# Altium footprint library Molex FFC - FPC Connectors (SMT).PcbLib: 638 footprints (part 27 of 40)
Each footprint in its own frame and in the unit in brackets; x right, y up, seen from the top. Pads: shape width x height; smd on the part's side, far side on the other; paste and mask are expansions set on the pad; w line width, h text height; cw(c..) or ccw(c..) is an arc to the next point about the centre after c.
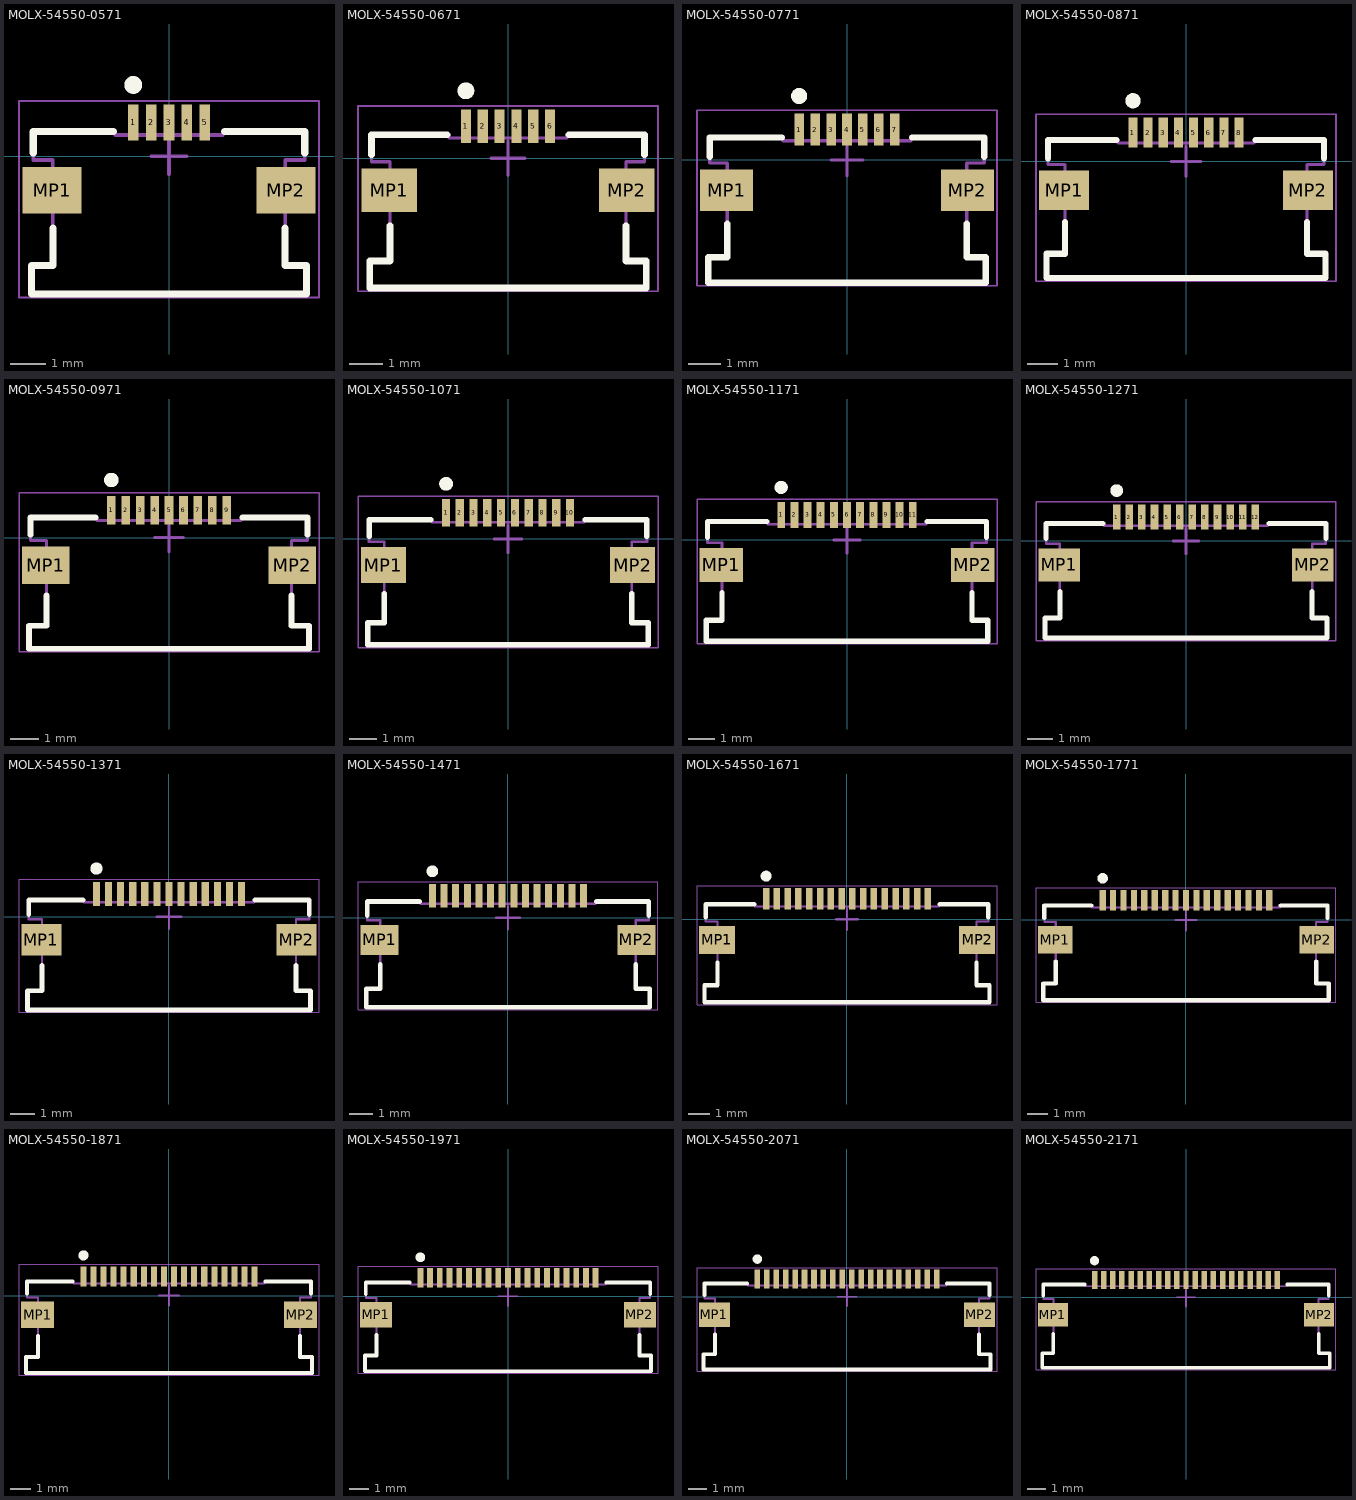
[diagram p26: the footprints below, top view; thin cyan lines are the x and y axes]

## MOLX-54550-0571 [mm] "FPC Connector, 5-Leads, Right Angle, Pitch 0.5 mm, Mated Height 1.2 mm, SMT"
height 1.212
pads (7):
  rect 0.3x1 smd: 1(-1,0.95) 2(-0.5,0.95) 3(0,0.95) 4(0.5,0.95) 5(1,0.95)
  rect 1.65x1.3 smd: MP1(-3.275,-0.95) MP2(3.275,-0.95)
Top Overlay:
  circle w0.25: c-1,2 r0.125
  lines w0.2: -3.85,-3.85 -3.85,-3.05 -3.25,-3.05 -3.25,-2 ; -3.85,-3.85 3.85,-3.85 ; -3.8,0.1 -3.8,0.7 -1.55,0.7 ; 1.55,0.7 3.8,0.7 3.8,0.1 ; 3.25,-2 3.25,-3.05 3.85,-3.05 3.85,-3.85
Mechanical 13:
  lines w0.1: -3.85,-3.85 -3.85,-3.05 -3.25,-3.05 -3.25,-0.1 -3.8,-0.1 -3.8,0.7 -1.5,0.7 -1.5,0.6 1.5,0.6 1.5,0.7 3.8,0.7 3.8,-0.1 3.25,-0.1 3.25,-3.05 3.85,-3.05 3.85,-3.85 -3.85,-3.85
Mechanical 15:
  lines w0.05: -4.2,-3.95 -4.2,1.55 4.2,1.55 4.2,-3.95 -4.2,-3.95
  lines w0.1: -0.5,0 0.5,0 ; 0,-0.5 0,0.5
3D body: height 0.25, standoff 0, extent -3.85,-3.85 3.85,1.15

## MOLX-54550-0671 [mm] "FPC Connector, 6-Leads, Right Angle, Pitch 0.5 mm, Mated Height 1.2 mm, SMT"
height 1.212
pads (8):
  rect 0.3x1 smd: 1(-1.25,0.95) 2(-0.75,0.95) 3(-0.25,0.95) 4(0.25,0.95) 5(0.75,0.95) 6(1.25,0.95)
  rect 1.65x1.3 smd: MP1(-3.525,-0.95) MP2(3.525,-0.95)
Top Overlay:
  circle w0.25: c-1.25,2 r0.125
  lines w0.2: -4.1,-3.85 -4.1,-3.05 -3.5,-3.05 -3.5,-2 ; -4.1,-3.85 4.1,-3.85 ; -4.05,0.1 -4.05,0.7 -1.8,0.7 ; 1.8,0.7 4.05,0.7 4.05,0.1 ; 3.5,-2 3.5,-3.05 4.1,-3.05 4.1,-3.85
Mechanical 13:
  lines w0.1: -4.1,-3.85 -4.1,-3.05 -3.5,-3.05 -3.5,-0.1 -4.05,-0.1 -4.05,0.7 -1.75,0.7 -1.75,0.6 1.75,0.6 1.75,0.7 4.05,0.7 4.05,-0.1 3.5,-0.1 3.5,-3.05 4.1,-3.05 4.1,-3.85 -4.1,-3.85
Mechanical 15:
  lines w0.05: -4.45,-3.95 -4.45,1.55 4.45,1.55 4.45,-3.95 -4.45,-3.95
  lines w0.1: -0.5,0 0.5,0 ; 0,-0.5 0,0.5
3D body: height 0.25, standoff 0, extent -4.1,-3.85 4.1,1.15

## MOLX-54550-0771 [mm] "FPC Connector, 7-Leads, Right Angle, Pitch 0.5 mm, Mated Height 1.2 mm, SMT"
height 1.212
pads (9):
  rect 0.3x1 smd: 1(-1.5,0.95) 2(-1,0.95) 3(-0.5,0.95) 4(0,0.95) 5(0.5,0.95) 6(1,0.95) 7(1.5,0.95)
  rect 1.65x1.3 smd: MP1(-3.775,-0.95) MP2(3.775,-0.95)
Top Overlay:
  circle w0.25: c-1.5,2 r0.125
  lines w0.2: -4.35,-3.85 -4.35,-3.05 -3.75,-3.05 -3.75,-2 ; -4.35,-3.85 4.35,-3.85 ; -4.3,0.1 -4.3,0.7 -2.05,0.7 ; 2.05,0.7 4.3,0.7 4.3,0.1 ; 3.75,-2 3.75,-3.05 4.35,-3.05 4.35,-3.85
Mechanical 13:
  lines w0.1: -4.35,-3.85 -4.35,-3.05 -3.75,-3.05 -3.75,-0.1 -4.3,-0.1 -4.3,0.7 -2,0.7 -2,0.6 2,0.6 2,0.7 4.3,0.7 4.3,-0.1 3.75,-0.1 3.75,-3.05 4.35,-3.05 4.35,-3.85 -4.35,-3.85
Mechanical 15:
  lines w0.05: -4.7,-3.95 4.7,-3.95 4.7,1.55 -4.7,1.55 -4.7,-3.95
  lines w0.1: -0.5,0 0.5,0 ; 0,-0.5 0,0.5
3D body: height 0.25, standoff 0, extent -4.35,-3.85 4.35,1.15

## MOLX-54550-0871 [mm] "FPC Connector, 8-Leads, Right Angle, Pitch 0.5 mm, Mated Height 1.2 mm, SMT"
height 1.212
pads (10):
  rect 0.3x1 smd: 1(-1.75,0.95) 2(-1.25,0.95) 3(-0.75,0.95) 4(-0.25,0.95) 5(0.25,0.95) 6(0.75,0.95) 7(1.25,0.95) 8(1.75,0.95)
  rect 1.65x1.3 smd: MP1(-4.025,-0.95) MP2(4.025,-0.95)
Top Overlay:
  circle w0.25: c-1.75,2 r0.125
  lines w0.2: -4.6,-3.85 -4.6,-3.05 -4,-3.05 -4,-2 ; -4.6,-3.85 4.6,-3.85 ; -4.55,0.1 -4.55,0.7 -2.3,0.7 ; 2.3,0.7 4.55,0.7 4.55,0.1 ; 4,-2 4,-3.05 4.6,-3.05 4.6,-3.85
Mechanical 13:
  lines w0.1: -4.6,-3.85 -4.6,-3.05 -4,-3.05 -4,-0.1 -4.55,-0.1 -4.55,0.7 -2.25,0.7 -2.25,0.6 2.25,0.6 2.25,0.7 4.55,0.7 4.55,-0.1 4,-0.1 4,-3.05 4.6,-3.05 4.6,-3.85 -4.6,-3.85
Mechanical 15:
  lines w0.05: -4.95,-3.95 -4.95,1.55 4.95,1.55 4.95,-3.95 -4.95,-3.95
  lines w0.1: -0.5,0 0.5,0 ; 0,-0.5 0,0.5
3D body: height 0.25, standoff 0, extent -4.6,-3.85 4.6,1.15

## MOLX-54550-0971 [mm] "FPC Connector, 9-Leads, Right Angle, Pitch 0.5 mm, Mated Height 1.2 mm, SMT"
height 1.212
pads (11):
  rect 0.3x1 smd: 1(-2,0.95) 2(-1.5,0.95) 3(-1,0.95) 4(-0.5,0.95) 5(0,0.95) 6(0.5,0.95) 7(1,0.95) 8(1.5,0.95) 9(2,0.95)
  rect 1.65x1.3 smd: MP1(-4.275,-0.95) MP2(4.275,-0.95)
Top Overlay:
  circle w0.25: c-2,2 r0.125
  lines w0.2: -4.85,-3.85 -4.85,-3.05 -4.25,-3.05 -4.25,-2 ; -4.85,-3.85 4.85,-3.85 ; -4.8,0.1 -4.8,0.7 -2.55,0.7 ; 2.55,0.7 4.8,0.7 4.8,0.1 ; 4.25,-2 4.25,-3.05 4.85,-3.05 4.85,-3.85
Mechanical 13:
  lines w0.1: -4.85,-3.85 -4.85,-3.05 -4.25,-3.05 -4.25,-0.1 -4.8,-0.1 -4.8,0.7 -2.5,0.7 -2.5,0.6 2.5,0.6 2.5,0.7 4.8,0.7 4.8,-0.1 4.25,-0.1 4.25,-3.05 4.85,-3.05 4.85,-3.85 -4.85,-3.85
Mechanical 15:
  lines w0.05: -5.2,-3.95 5.2,-3.95 5.2,1.55 -5.2,1.55 -5.2,-3.95
  lines w0.1: -0.5,0 0.5,0 ; 0,-0.5 0,0.5
3D body: height 0.25, standoff 0, extent -4.85,-3.85 4.85,1.15

## MOLX-54550-1071 [mm] "FPC Connector, 10-Leads, Right Angle, Pitch 0.5 mm, Mated Height 1.2 mm, SMT"
height 1.212
pads (12):
  rect 0.3x1 smd: 1(-2.25,0.95) 2(-1.75,0.95) 3(-1.25,0.95) 4(-0.75,0.95) 5(-0.25,0.95) 6(0.25,0.95) 7(0.75,0.95) 8(1.25,0.95) 9(1.75,0.95) 10(2.25,0.95)
  rect 1.65x1.3 smd: MP1(-4.525,-0.95) MP2(4.525,-0.95)
Top Overlay:
  circle w0.25: c-2.25,2 r0.125
  lines w0.2: -5.1,-3.85 -5.1,-3.05 -4.5,-3.05 -4.5,-2 ; -5.1,-3.85 5.1,-3.85 ; -5.05,0.1 -5.05,0.7 -2.8,0.7 ; 2.8,0.7 5.05,0.7 5.05,0.1 ; 4.5,-2 4.5,-3.05 5.1,-3.05 5.1,-3.85
Mechanical 13:
  lines w0.1: -5.1,-3.85 -5.1,-3.05 -4.5,-3.05 -4.5,-0.1 -5.05,-0.1 -5.05,0.7 -2.75,0.7 -2.75,0.6 2.75,0.6 2.75,0.7 5.05,0.7 5.05,-0.1 4.5,-0.1 4.5,-3.05 5.1,-3.05 5.1,-3.85 -5.1,-3.85
Mechanical 15:
  lines w0.05: -5.45,-3.95 5.45,-3.95 5.45,1.55 -5.45,1.55 -5.45,-3.95
  lines w0.1: -0.5,0 0.5,0 ; 0,-0.5 0,0.5
3D body: height 0.25, standoff 0, extent -5.1,-3.85 5.1,1.15

## MOLX-54550-1171 [mm] "FPC Connector, 11-Leads, Right Angle, Pitch 0.5 mm, Mated Height 1.2 mm, SMT"
height 1.212
pads (13):
  rect 0.3x1 smd: 1(-2.5,0.95) 2(-2,0.95) 3(-1.5,0.95) 4(-1,0.95) 5(-0.5,0.95) 6(0,0.95) 7(0.5,0.95) 8(1,0.95) 9(1.5,0.95) 10(2,0.95) 11(2.5,0.95)
  rect 1.65x1.3 smd: MP1(-4.775,-0.95) MP2(4.775,-0.95)
Top Overlay:
  circle w0.25: c-2.5,2 r0.125
  lines w0.2: -5.35,-3.85 -5.35,-3.05 -4.75,-3.05 -4.75,-2 ; -5.35,-3.85 5.35,-3.85 ; -5.3,0.1 -5.3,0.7 -3.05,0.7 ; 3.05,0.7 5.3,0.7 5.3,0.1 ; 4.75,-2 4.75,-3.05 5.35,-3.05 5.35,-3.85
Mechanical 13:
  lines w0.1: -5.35,-3.85 -5.35,-3.05 -4.75,-3.05 -4.75,-0.1 -5.3,-0.1 -5.3,0.7 -3,0.7 -3,0.6 3,0.6 3,0.7 5.3,0.7 5.3,-0.1 4.75,-0.1 4.75,-3.05 5.35,-3.05 5.35,-3.85 -5.35,-3.85
Mechanical 15:
  lines w0.05: -5.7,-3.95 5.7,-3.95 5.7,1.55 -5.7,1.55 -5.7,-3.95
  lines w0.1: -0.5,0 0.5,0 ; 0,-0.5 0,0.5
3D body: height 0.25, standoff 0, extent -5.35,-3.85 5.35,1.15

## MOLX-54550-1271 [mm] "FPC Connector, 12-Leads, Right Angle, Pitch 0.5 mm, Mated Height 1.2 mm, SMT"
height 1.212
pads (14):
  rect 0.3x1 smd: 1(-2.75,0.95) 2(-2.25,0.95) 3(-1.75,0.95) 4(-1.25,0.95) 5(-0.75,0.95) 6(-0.25,0.95) 7(0.25,0.95) 8(0.75,0.95) 9(1.25,0.95) 10(1.75,0.95) 11(2.25,0.95) 12(2.75,0.95)
  rect 1.65x1.3 smd: MP1(-5.025,-0.95) MP2(5.025,-0.95)
Top Overlay:
  circle w0.25: c-2.75,2 r0.125
  lines w0.2: -5.6,-3.85 -5.6,-3.05 -5,-3.05 -5,-2 ; -5.6,-3.85 5.6,-3.85 ; -5.55,0.1 -5.55,0.7 -3.3,0.7 ; 3.3,0.7 5.55,0.7 5.55,0.1 ; 5,-2 5,-3.05 5.6,-3.05 5.6,-3.85
Mechanical 13:
  lines w0.1: -5.6,-3.85 -5.6,-3.05 -5,-3.05 -5,-0.1 -5.55,-0.1 -5.55,0.7 -3.25,0.7 -3.25,0.6 3.25,0.6 3.25,0.7 5.55,0.7 5.55,-0.1 5,-0.1 5,-3.05 5.6,-3.05 5.6,-3.85 -5.6,-3.85
Mechanical 15:
  lines w0.05: -5.95,-3.95 -5.95,1.55 5.95,1.55 5.95,-3.95 -5.95,-3.95
  lines w0.1: -0.5,0 0.5,0 ; 0,-0.5 0,0.5
3D body: height 0.25, standoff 0, extent -5.6,-3.85 5.6,1.15

## MOLX-54550-1371 [mm] "FPC Connector, 13-Leads, Right Angle, Pitch 0.5 mm, Mated Height 1.2 mm, SMT"
height 1.212
pads (15):
  rect 0.3x1 smd: 1(-3,0.95) 2(-2.5,0.95) 3(-2,0.95) 4(-1.5,0.95) 5(-1,0.95) 6(-0.5,0.95) 7(0,0.95) 8(0.5,0.95) 9(1,0.95) 10(1.5,0.95) 11(2,0.95) 12(2.5,0.95) 13(3,0.95)
  rect 1.65x1.3 smd: MP1(-5.275,-0.95) MP2(5.275,-0.95)
Top Overlay:
  circle w0.25: c-3,2 r0.125
  lines w0.2: -5.85,-3.85 -5.85,-3.05 -5.25,-3.05 -5.25,-2 ; -5.85,-3.85 5.85,-3.85 ; -5.8,0.1 -5.8,0.7 -3.55,0.7 ; 3.55,0.7 5.8,0.7 5.8,0.1 ; 5.25,-2 5.25,-3.05 5.85,-3.05 5.85,-3.85
Mechanical 13:
  lines w0.1: -5.85,-3.85 -5.85,-3.05 -5.25,-3.05 -5.25,-0.1 -5.8,-0.1 -5.8,0.7 -3.5,0.7 -3.5,0.6 3.5,0.6 3.5,0.7 5.8,0.7 5.8,-0.1 5.25,-0.1 5.25,-3.05 5.85,-3.05 5.85,-3.85 -5.85,-3.85
Mechanical 15:
  lines w0.05: -6.2,-3.95 6.2,-3.95 6.2,1.55 -6.2,1.55 -6.2,-3.95
  lines w0.1: -0.5,0 0.5,0 ; 0,-0.5 0,0.5
3D body: height 0.25, standoff 0, extent -5.85,-3.85 5.85,1.15

## MOLX-54550-1471 [mm] "FPC Connector, 14-Leads, Right Angle, Pitch 0.5 mm, Mated Height 1.2 mm, SMT"
height 1.212
pads (16):
  rect 0.3x1 smd: 1(-3.25,0.95) 2(-2.75,0.95) 3(-2.25,0.95) 4(-1.75,0.95) 5(-1.25,0.95) 6(-0.75,0.95) 7(-0.25,0.95) 8(0.25,0.95) 9(0.75,0.95) 10(1.25,0.95) 11(1.75,0.95) 12(2.25,0.95) 13(2.75,0.95) 14(3.25,0.95)
  rect 1.65x1.3 smd: MP1(-5.525,-0.95) MP2(5.525,-0.95)
Top Overlay:
  circle w0.25: c-3.25,2 r0.125
  lines w0.2: -6.1,-3.85 -6.1,-3.05 -5.5,-3.05 -5.5,-2 ; -6.1,-3.85 6.1,-3.85 ; -6.05,0.1 -6.05,0.7 -3.8,0.7 ; 3.8,0.7 6.05,0.7 6.05,0.1 ; 5.5,-2 5.5,-3.05 6.1,-3.05 6.1,-3.85
Mechanical 13:
  lines w0.1: -6.1,-3.85 -6.1,-3.05 -5.5,-3.05 -5.5,-0.1 -6.05,-0.1 -6.05,0.7 -3.75,0.7 -3.75,0.6 3.75,0.6 3.75,0.7 6.05,0.7 6.05,-0.1 5.5,-0.1 5.5,-3.05 6.1,-3.05 6.1,-3.85 -6.1,-3.85
Mechanical 15:
  lines w0.05: -6.45,-3.95 -6.45,1.55 6.45,1.55 6.45,-3.95 -6.45,-3.95
  lines w0.1: -0.5,0 0.5,0 ; 0,-0.5 0,0.5
3D body: height 0.25, standoff 0, extent -6.1,-3.85 6.1,1.15

## MOLX-54550-1671 [mm] "FPC Connector, 16-Leads, Right Angle, Pitch 0.5 mm, Mated Height 1.2 mm, SMT"
height 1.212
pads (18):
  rect 0.3x1 smd: 1(-3.75,0.95) 2(-3.25,0.95) 3(-2.75,0.95) 4(-2.25,0.95) 5(-1.75,0.95) 6(-1.25,0.95) 7(-0.75,0.95) 8(-0.25,0.95) 9(0.25,0.95) 10(0.75,0.95) 11(1.25,0.95) 12(1.75,0.95) 13(2.25,0.95) 14(2.75,0.95) 15(3.25,0.95) 16(3.75,0.95)
  rect 1.65x1.3 smd: MP1(-6.025,-0.95) MP2(6.025,-0.95)
Top Overlay:
  circle w0.25: c-3.75,2 r0.125
  lines w0.2: -6.6,-3.85 -6.6,-3.05 -6,-3.05 -6,-2 ; -6.6,-3.85 6.6,-3.85 ; -6.55,0.1 -6.55,0.7 -4.3,0.7 ; 4.3,0.7 6.55,0.7 6.55,0.1 ; 6,-2 6,-3.05 6.6,-3.05 6.6,-3.85
Mechanical 13:
  lines w0.1: -6.6,-3.85 -6.6,-3.05 -6,-3.05 -6,-0.1 -6.55,-0.1 -6.55,0.7 -4.25,0.7 -4.25,0.6 4.25,0.6 4.25,0.7 6.55,0.7 6.55,-0.1 6,-0.1 6,-3.05 6.6,-3.05 6.6,-3.85 -6.6,-3.85
Mechanical 15:
  lines w0.05: -6.95,-3.95 -6.95,1.55 6.95,1.55 6.95,-3.95 -6.95,-3.95
  lines w0.1: -0.5,0 0.5,0 ; 0,-0.5 0,0.5
3D body: height 0.25, standoff 0, extent -6.6,-3.85 6.6,1.15

## MOLX-54550-1771 [mm] "FPC Connector, 17-Leads, Right Angle, Pitch 0.5 mm, Mated Height 1.2 mm, SMT"
height 1.212
pads (19):
  rect 0.3x1 smd: 1(-4,0.95) 2(-3.5,0.95) 3(-3,0.95) 4(-2.5,0.95) 5(-2,0.95) 6(-1.5,0.95) 7(-1,0.95) 8(-0.5,0.95) 9(0,0.95) 10(0.5,0.95) 11(1,0.95) 12(1.5,0.95) 13(2,0.95) 14(2.5,0.95) 15(3,0.95) 16(3.5,0.95) 17(4,0.95)
  rect 1.65x1.3 smd: MP1(-6.275,-0.95) MP2(6.275,-0.95)
Top Overlay:
  circle w0.25: c-4,2 r0.125
  lines w0.2: -6.85,-3.85 -6.85,-3.05 -6.25,-3.05 -6.25,-2 ; -6.85,-3.85 6.85,-3.85 ; -6.8,0.1 -6.8,0.7 -4.55,0.7 ; 4.55,0.7 6.8,0.7 6.8,0.1 ; 6.25,-2 6.25,-3.05 6.85,-3.05 6.85,-3.85
Mechanical 13:
  lines w0.1: -6.85,-3.85 -6.85,-3.05 -6.25,-3.05 -6.25,-0.1 -6.8,-0.1 -6.8,0.7 -4.5,0.7 -4.5,0.6 4.5,0.6 4.5,0.7 6.8,0.7 6.8,-0.1 6.25,-0.1 6.25,-3.05 6.85,-3.05 6.85,-3.85 -6.85,-3.85
Mechanical 15:
  lines w0.05: -7.2,-3.95 -7.2,1.55 7.2,1.55 7.2,-3.95 -7.2,-3.95
  lines w0.1: -0.5,0 0.5,0 ; 0,-0.5 0,0.5
3D body: height 0.25, standoff 0, extent -6.85,-3.85 6.85,1.15

## MOLX-54550-1871 [mm] "FPC Connector, 18-Leads, Right Angle, Pitch 0.5 mm, Mated Height 1.2 mm, SMT"
height 1.212
pads (20):
  rect 0.3x1 smd: 1(-4.25,0.95) 2(-3.75,0.95) 3(-3.25,0.95) 4(-2.75,0.95) 5(-2.25,0.95) 6(-1.75,0.95) 7(-1.25,0.95) 8(-0.75,0.95) 9(-0.25,0.95) 10(0.25,0.95) 11(0.75,0.95) 12(1.25,0.95) 13(1.75,0.95) 14(2.25,0.95) 15(2.75,0.95) 16(3.25,0.95) 17(3.75,0.95) 18(4.25,0.95)
  rect 1.65x1.3 smd: MP1(-6.525,-0.95) MP2(6.525,-0.95)
Top Overlay:
  circle w0.25: c-4.25,2 r0.125
  lines w0.2: -7.1,-3.85 -7.1,-3.05 -6.5,-3.05 -6.5,-2 ; -7.1,-3.85 7.1,-3.85 ; -7.05,0.1 -7.05,0.7 -4.8,0.7 ; 4.8,0.7 7.05,0.7 7.05,0.1 ; 6.5,-2 6.5,-3.05 7.1,-3.05 7.1,-3.85
Mechanical 13:
  lines w0.1: -7.1,-3.85 -7.1,-3.05 -6.5,-3.05 -6.5,-0.1 -7.05,-0.1 -7.05,0.7 -4.75,0.7 -4.75,0.6 4.75,0.6 4.75,0.7 7.05,0.7 7.05,-0.1 6.5,-0.1 6.5,-3.05 7.1,-3.05 7.1,-3.85 -7.1,-3.85
Mechanical 15:
  lines w0.05: -7.45,-3.95 -7.45,1.55 7.45,1.55 7.45,-3.95 -7.45,-3.95
  lines w0.1: -0.5,0 0.5,0 ; 0,-0.5 0,0.5
3D body: height 0.25, standoff 0, extent -7.1,-3.85 7.1,1.15

## MOLX-54550-1971 [mm] "FPC Connector, 19-Leads, Right Angle, Pitch 0.5 mm, Mated Height 1.2 mm, SMT"
height 1.212
pads (21):
  rect 0.3x1 smd: 1(-4.5,0.95) 2(-4,0.95) 3(-3.5,0.95) 4(-3,0.95) 5(-2.5,0.95) 6(-2,0.95) 7(-1.5,0.95) 8(-1,0.95) 9(-0.5,0.95) 10(0,0.95) 11(0.5,0.95) 12(1,0.95) 13(1.5,0.95) 14(2,0.95) 15(2.5,0.95) 16(3,0.95) 17(3.5,0.95) 18(4,0.95) 19(4.5,0.95)
  rect 1.65x1.3 smd: MP1(-6.775,-0.95) MP2(6.775,-0.95)
Top Overlay:
  circle w0.25: c-4.5,2 r0.125
  lines w0.2: -7.35,-3.85 -7.35,-3.05 -6.75,-3.05 -6.75,-2 ; -7.35,-3.85 7.35,-3.85 ; -7.3,0.1 -7.3,0.7 -5.05,0.7 ; 5.05,0.7 7.3,0.7 7.3,0.1 ; 6.75,-2 6.75,-3.05 7.35,-3.05 7.35,-3.85
Mechanical 13:
  lines w0.1: -7.35,-3.85 -7.35,-3.05 -6.75,-3.05 -6.75,-0.1 -7.3,-0.1 -7.3,0.7 -5,0.7 -5,0.6 5,0.6 5,0.7 7.3,0.7 7.3,-0.1 6.75,-0.1 6.75,-3.05 7.35,-3.05 7.35,-3.85 -7.35,-3.85
Mechanical 15:
  lines w0.05: -7.7,-3.95 -7.7,1.55 7.7,1.55 7.7,-3.95 -7.7,-3.95
  lines w0.1: -0.5,0 0.5,0 ; 0,-0.5 0,0.5
3D body: height 0.25, standoff 0, extent -7.35,-3.85 7.35,1.15

## MOLX-54550-2071 [mm] "FPC Connector, 20-Leads, Right Angle, Pitch 0.5 mm, Mated Height 1.2 mm, SMT"
height 1.212
pads (22):
  rect 0.3x1 smd: 1(-4.75,0.95) 2(-4.25,0.95) 3(-3.75,0.95) 4(-3.25,0.95) 5(-2.75,0.95) 6(-2.25,0.95) 7(-1.75,0.95) 8(-1.25,0.95) 9(-0.75,0.95) 10(-0.25,0.95) 11(0.25,0.95) 12(0.75,0.95) 13(1.25,0.95) 14(1.75,0.95) 15(2.25,0.95) 16(2.75,0.95) 17(3.25,0.95) 18(3.75,0.95) 19(4.25,0.95) 20(4.75,0.95)
  rect 1.65x1.3 smd: MP1(-7.025,-0.95) MP2(7.025,-0.95)
Top Overlay:
  circle w0.25: c-4.75,2 r0.125
  lines w0.2: -7.6,-3.85 -7.6,-3.05 -7,-3.05 -7,-2 ; -7.6,-3.85 7.6,-3.85 ; -7.55,0.1 -7.55,0.7 -5.3,0.7 ; 5.3,0.7 7.55,0.7 7.55,0.1 ; 7,-2 7,-3.05 7.6,-3.05 7.6,-3.85
Mechanical 13:
  lines w0.1: -7.6,-3.85 -7.6,-3.05 -7,-3.05 -7,-0.1 -7.55,-0.1 -7.55,0.7 -5.25,0.7 -5.25,0.6 5.25,0.6 5.25,0.7 7.55,0.7 7.55,-0.1 7,-0.1 7,-3.05 7.6,-3.05 7.6,-3.85 -7.6,-3.85
Mechanical 15:
  lines w0.05: -7.95,-3.95 -7.95,1.55 7.95,1.55 7.95,-3.95 -7.95,-3.95
  lines w0.1: -0.5,0 0.5,0 ; 0,-0.5 0,0.5
3D body: height 0.25, standoff 0, extent -7.6,-3.85 7.6,1.15

## MOLX-54550-2171 [mm] "FPC Connector, 21-Leads, Right Angle, Pitch 0.5 mm, Mated Height 1.2 mm, SMT"
height 1.212
pads (23):
  rect 0.3x1 smd: 1(-5,0.95) 2(-4.5,0.95) 3(-4,0.95) 4(-3.5,0.95) 5(-3,0.95) 6(-2.5,0.95) 7(-2,0.95) 8(-1.5,0.95) 9(-1,0.95) 10(-0.5,0.95) 11(0,0.95) 12(0.5,0.95) 13(1,0.95) 14(1.5,0.95) 15(2,0.95) 16(2.5,0.95) 17(3,0.95) 18(3.5,0.95) 19(4,0.95) 20(4.5,0.95) 21(5,0.95)
  rect 1.65x1.3 smd: MP1(-7.275,-0.95) MP2(7.275,-0.95)
Top Overlay:
  circle w0.25: c-5,2 r0.125
  lines w0.2: -7.85,-3.85 -7.85,-3.05 -7.25,-3.05 -7.25,-2 ; -7.85,-3.85 7.85,-3.85 ; -7.8,0.1 -7.8,0.7 -5.55,0.7 ; 5.55,0.7 7.8,0.7 7.8,0.1 ; 7.25,-2 7.25,-3.05 7.85,-3.05 7.85,-3.85
Mechanical 13:
  lines w0.1: -7.85,-3.85 -7.85,-3.05 -7.25,-3.05 -7.25,-0.1 -7.8,-0.1 -7.8,0.7 -5.5,0.7 -5.5,0.6 5.5,0.6 5.5,0.7 7.8,0.7 7.8,-0.1 7.25,-0.1 7.25,-3.05 7.85,-3.05 7.85,-3.85 -7.85,-3.85
Mechanical 15:
  lines w0.05: -8.2,-3.95 8.2,-3.95 8.2,1.55 -8.2,1.55 -8.2,-3.95
  lines w0.1: -0.5,0 0.5,0 ; 0,-0.5 0,0.5
3D body: height 0.25, standoff 0, extent -7.85,-3.85 7.85,1.15